# Altium footprint library ZLS_Lib.PcbLib: 157 footprints (part 4 of 10)
Each footprint in its own frame and in the unit in brackets; x right, y up, seen from the top. Pads: shape width x height; smd on the part's side, far side on the other; paste and mask are expansions set on the pad; w line width, h text height; cw(c..) or ccw(c..) is an arc to the next point about the centre after c.
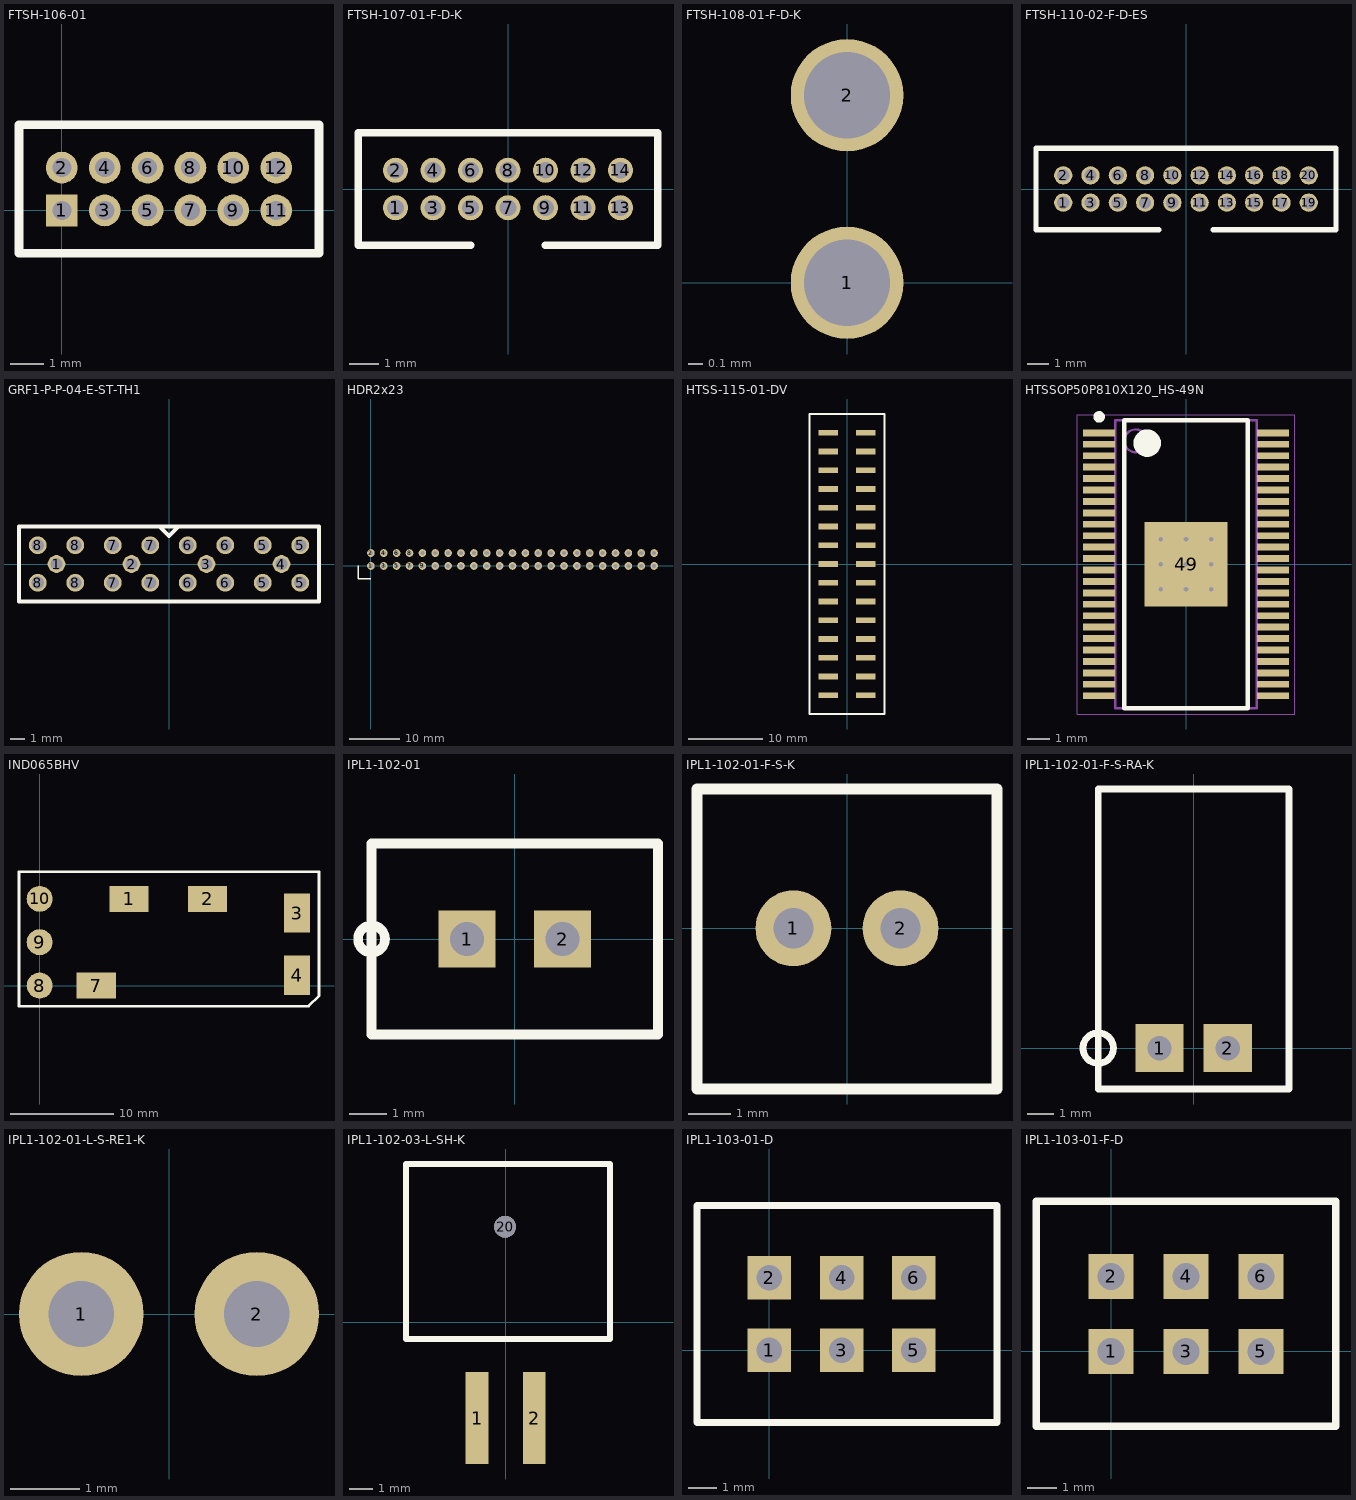
[diagram p3: the footprints below, top view; thin cyan lines are the x and y axes]

## FTSH-106-01 [mil]
height 433.07
pads (12):
  rect 37x37 hole 22.27: 1(0,0)
  round 37 hole 22.27 paste+2: 2(0,50)
  round 37 hole 22.27: 3(50,0) 4(50,50) 5(100,0) 6(100,50) 7(150,0) 8(150,50) 9(200,0) 10(200,50) 11(250,0) 12(250,50)
Top Overlay:
  lines w10: -50,-50 -50,100 300,100 300,-50 -50,-50
3D body "_FTSH_106_01_F_D_001_K_body_2.sldprt": height 225, standoff 0, extent -29,-76 271,124
3D body "_FTSH_106_01_F_D_K_pins1_4.sldprt": height 219, standoff 50, extent -12,-9 254,57
3D body "_FTSH_106_01_F_D_K_pins2_6.sldprt": height 26.18, standoff -90, extent -10,-6 256,60

## FTSH-107-01-F-D-K [mm]
height 10
pads (14):
  round 0.85 hole 0.57: 1(-3.81,-0.635) 2(-3.81,0.635) 3(-2.54,-0.635) 4(-2.54,0.635) 5(-1.27,-0.635) 6(-1.27,0.635) 7(0,-0.635) 8(0,0.635) 9(1.27,-0.635) 10(1.27,0.635) 11(2.54,-0.635) 12(2.54,0.635) 13(3.81,-0.635) 14(3.81,0.635)
Top Overlay:
  lines w0.254: -1.27,-1.905 -5.08,-1.905 -5.08,1.905 5.08,1.905 5.08,-1.905 1.27,-1.905
3D body "_FTSH_107_01_F_D_K_body_2.sldprt": height 5.71, standoff 0, extent -4.445,-2.54 4.445,2.54
3D body "_FTSH_107_01_F_D_K_pins2_6.sldprt": height 1.16, standoff -1.79, extent -4.013,-0.889 4.013,0.787
3D body "_FTSH_107_01_F_D_K_pins2_6.sldprt": height 4.79, standoff 1.84, extent -4.013,-0.838 4.013,0.838

## FTSH-108-01-F-D-K [mil]
height 440.16
pads (2):
  round 30 hole 23: 1(0,0) 2(0,50)

## FTSH-110-02-F-D-ES [mm] "CONN HEADER VERT 20POS 1.27MM"
height 2.51
pads (20):
  round 0.85 hole 0.57: 1(-5.715,-0.635) 2(-5.715,0.635) 3(-4.445,-0.635) 4(-4.445,0.635) 5(-3.175,-0.635) 6(-3.175,0.635) 7(-1.905,-0.635) 8(-1.905,0.635) 9(-0.635,-0.635) 10(-0.635,0.635) 11(0.635,-0.635) 12(0.635,0.635) 13(1.905,-0.635) 14(1.905,0.635) 15(3.175,-0.635) 16(3.175,0.635) 17(4.445,-0.635) 18(4.445,0.635) 19(5.715,-0.635) 20(5.715,0.635)
Top Overlay:
  lines w0.254: -1.27,-1.905 -6.985,-1.905 -6.985,1.905 6.985,1.905 6.985,-1.905 1.27,-1.905
3D body "_FTSH_110_02_F_D_ES_pins1_4.sldprt": height 4.42, standoff 1.27, extent -5.918,-0.838 5.918,0.838
3D body "_FTSH_110_02_F_D_ES_pins2_6.sldprt": height 0.66, standoff -2.29, extent -5.918,-0.838 5.918,0.838
3D body "_FTSH_110_02_F_D_ES_body_2.sldprt": height 2.51, standoff 0, extent -6.35,-1.778 6.35,1.651
3D body "_FTSH_ES_shrouds_8.sldprt": height 4.52, standoff 0.25, extent -7.328,-2.438 -0.597,2.337
3D body "_FTSH_ES_shrouds_8.sldprt": height 4.52, standoff 0.25, extent 0.762,-2.438 7.493,2.337

## GRF1-P-P-04-E-ST-TH1 [mm]
height 4.5
pads (20):
  round 1.2 hole 0.84: 1(-7.62,0) 2(-2.54,0) 3(2.54,0) 4(7.62,0) 5(6.35,-1.27) 5(6.35,1.27) 5(8.89,-1.27) 5(8.89,1.27) 6(1.27,-1.27) 6(1.27,1.27) 6(3.81,-1.27) 6(3.81,1.27) 7(-3.81,-1.27) 7(-3.81,1.27) 7(-1.27,-1.27) 7(-1.27,1.27) 8(-8.89,-1.27) 8(-8.89,1.27) 8(-6.35,-1.27) 8(-6.35,1.27)
Top Overlay:
  lines w0.254: -0.635,2.54 0,1.905 0.635,2.54 ; -10.16,-2.54 10.16,-2.54 10.16,2.54 -10.16,2.54 -10.16,-2.54
3D body "_GRF1_P_P_04_E_ST_TH1_p_8.sldprt": height 4.5, standoff -2.8, extent -8.045,-0.425 -7.195,0.425
3D body "_GRF1_P_P_04_E_ST_TH1_p_8.sldprt": height 4.5, standoff -2.8, extent 2.115,-0.425 2.965,0.425
3D body "_GRF1_P_P_04_E_ST_TH1_p_8.sldprt": height 4.5, standoff -2.8, extent 7.195,-0.425 8.045,0.425
3D body "_GRF1_P_P_04_E_ST_TH1_sh_4.sldprt": height 4.5, standoff -2.8, extent -9.37,-1.75 -5.87,1.75
3D body "_GRF1_P_P_04_E_ST_TH1_b_2.sldprt": height 3.8, standoff 0, extent -10,-2.5 10,2.5
3D body "_GRF1_P_P_04_E_ST_TH1_sh_4.sldprt": height 4.5, standoff -2.8, extent 0.79,-1.75 4.29,1.75
3D body "_GRF1_P_P_04_E_ST_TH1_sh_4.sldprt": height 4.5, standoff -2.8, extent 5.87,-1.75 9.37,1.75
3D body "_GRF1_P_P_04_E_ST_TH1_sh_4.sldprt": height 4.5, standoff -2.8, extent -4.29,-1.75 -0.79,1.75
3D body "_GRF1_P_P_04_E_ST_TH1_p_8.sldprt": height 4.5, standoff -2.8, extent -2.965,-0.425 -2.115,0.425
3D body "_GRF1_P_P_04_E_ST_TH1_i_6.sldprt": height 3.25, standoff 0.25, extent -8.78,-1.16 -6.46,1.16
3D body "_GRF1_P_P_04_E_ST_TH1_i_6.sldprt": height 3.25, standoff 0.25, extent -3.7,-1.16 -1.38,1.16
3D body "_GRF1_P_P_04_E_ST_TH1_i_6.sldprt": height 3.25, standoff 0.25, extent 1.38,-1.16 3.7,1.16
3D body "_GRF1_P_P_04_E_ST_TH1_i_6.sldprt": height 3.25, standoff 0.25, extent 6.46,-1.16 8.78,1.16

## HDR2x23 [mil]
height 375
pads (46):
  round 60 hole 31.5: 1(0,0) 2(0,100) 3(100,0) 4(100,100) 5(200,0) 6(200,100) 7(300,0) 8(300,100) 9(400,0) 10(400,100) 11(500,0) 12(500,100) 13(600,0) 14(600,100) 15(700,0) 16(700,100) 17(800,0) 18(800,100) 19(900,0) 20(900,100) 21(1000,0) 22(1000,100) 23(1100,0) 24(1100,100) 25(1200,0) 26(1200,100) 27(1300,0) 28(1300,100) 29(1400,0) 30(1400,100) 31(1500,0) 32(1500,100) 33(1600,0) 34(1600,100) 35(1700,0) 36(1700,100) 37(1800,0) 38(1800,100) 39(1900,0) 40(1900,100) 41(2000,0) 42(2000,100) 43(2100,0) 44(2100,100) 45(2200,0) 46(2200,100)
Top Overlay:
  lines w10: -100,0 -100,-100 0,-100
3D body: height 375, standoff 0, extent -34,-34 2234,134
3D body: height 375, standoff 0, extent -105,-105 5,5
3D body: height 375, standoff 0, extent -100.02,-100.02 0.02,0.02
3D body: height 375, standoff 0, extent -105,-105 2234,134

## HTSS-115-01-DV [mil]
height 385.04
pads (30):
  rect 105x31 smd: 1(-100,700) 2(100,700) 3(-100,600) 4(100,600) 5(-100,500) 6(100,500) 7(-100,400) 8(100,400) 9(-100,300) 10(100,300) 11(-100,200) 12(100,200) 13(-100,100) 14(100,100) 15(-100,0) 16(100,0) 17(-100,-100) 18(100,-100) 19(-100,-200) 20(100,-200) 21(-100,-300) 22(100,-300) 23(-100,-400) 24(100,-400) 25(-100,-500) 26(100,-500) 27(-100,-600) 28(100,-600) 29(-100,-700) 30(100,-700)
Top Overlay:
  lines w10: -200,-800 50,-800 ; -200,-800 -200,700 -200,800 200,800 200,-800 50,-800 ; -200,-800 50,-800
3D body "_T1SSW_115_22_G_D_VS_2.sldprt": height 345, standoff 10, extent -97.5,-760 97.5,760
3D body "_P2SSW_115_22_G_D_VS_4.sldprt": height 90, standoff 0, extent -145,-721 165,720

## HTSSOP50P810X120_HS-49N [mm] "HTSSOP, 48-Leads, Body 12.50x6.10mm, Pitch 0.50mm, Thermal Pad 3.70x3.65mm, IPC Medium Density"
height 1.2
pads (49):
  rect 1.4x0.3 smd: 1(-3.8,5.75) 2(-3.8,5.25) 3(-3.8,4.75) 4(-3.8,4.25) 5(-3.8,3.75) 6(-3.8,3.25) 7(-3.8,2.75) 8(-3.8,2.25) 9(-3.8,1.75) 10(-3.8,1.25) 11(-3.8,0.75) 12(-3.8,0.25) 13(-3.8,-0.25) 14(-3.8,-0.75) 15(-3.8,-1.25) 16(-3.8,-1.75) 17(-3.8,-2.25) 18(-3.8,-2.75) 19(-3.8,-3.25) 20(-3.8,-3.75) 21(-3.8,-4.25) 22(-3.8,-4.75) 23(-3.8,-5.25) 24(-3.8,-5.75) 25(3.8,-5.75) 26(3.8,-5.25) 27(3.8,-4.75) 28(3.8,-4.25) 29(3.8,-3.75) 30(3.8,-3.25) 31(3.8,-2.75) 32(3.8,-2.25) 33(3.8,-1.75) 34(3.8,-1.25) 35(3.8,-0.75) 36(3.8,-0.25) 37(3.8,0.25) 38(3.8,0.75) 39(3.8,1.25) 40(3.8,1.75) 41(3.8,2.25) 42(3.8,2.75) 43(3.8,3.25) 44(3.8,3.75) 45(3.8,4.25) 46(3.8,4.75) 47(3.8,5.25) 48(3.8,5.75)
  rect 3.65x3.7 smd: 49(0,0)
via 1.1,-1.1 diameter 0.5 hole 0.2
via 0,-1.1 diameter 0.5 hole 0.2
via -1.1,-1.1 diameter 0.5 hole 0.2
via 1.1,0 diameter 0.5 hole 0.2
via 0,0 diameter 0.5 hole 0.2
via -1.1,0 diameter 0.5 hole 0.2
via 1.1,1.1 diameter 0.5 hole 0.2
via 0,1.1 diameter 0.5 hole 0.2
via -1.1,1.1 diameter 0.5 hole 0.2
Top Overlay:
  circle w0.6: c-1.7,5.3 r0.3
  circle w0.25: c-3.8,6.45 r0.125
  lines w0.2: -2.7,-6.3 2.7,-6.3 2.7,6.3 -2.7,6.3 -2.7,-6.3
Mechanical 13:
  circle w0.1: c-2.2,5.4 r0.5
  lines w0.1: -3.1,-6.3 3.1,-6.3 3.1,6.3 -3.1,6.3 -3.1,-6.3
Mechanical 15:
  lines w0.05: -4.75,-6.55 4.75,-6.55 4.75,6.55 -4.75,6.55 -4.75,-6.55
  lines w0.1: -0.5,0 0.5,0 ; 0,-0.5 0,0.5
3D body "HTSSOP50P810X120_HS-49N.step": height 1.2, standoff 0, extent -4.05,-6.3 4.05,6.3

## IND065BHV [mm] "DC DC CONVERTER 32-54V 65W"
height 10
pads (8):
  rect 3.78x2.51 smd: 1(8.65,8.38) 2(16.24,8.38) 7(5.47,0)
  rect 2.51x3.78 smd: 3(24.89,7) 4(24.89,1)
  round 2.51 smd: 8(0,0) 9(0,4.19) 10(0,8.38)
Top Overlay:
  lines w0.254: -2,-2 -2,11 27,11 27,-1 26,-2 -2,-2
3D body "ABXS002A3X41-SRZ--3DModel-STEP-56544.STEP": height 5.92, standoff -1.57, extent -1.524,-1.524 26.416,9.906

## IPL1-102-01 [mil]
height 161
pads (2):
  rect 60x60 hole 35.43: 1(-50,0) 2(50,0)
Top Overlay:
  circle w10: c-150,0 r14.14
  lines w10: -150,-100 150,-100 150,100 -150,100 -150,-100
3D body "_IPL1_102_01_S_header_2.sldprt": height 320, standoff 0, extent -133.94,-130.91 126.06,129.09

## IPL1-102-01-F-S-K [mm]
height 10
pads (2):
  round 1.8 hole 0.95: 1(-1.27,0) 2(1.27,0)
Top Overlay:
  lines w0.254: -3.556,-3.81 3.556,-3.81 3.556,3.302 -3.556,3.302 -3.556,-3.81
3D body "_T_1S64_01_02_S_4.sldprt": height 7.75, standoff -3.05, extent -1.587,-0.063 1.588,0.572
3D body "_IPL1_102_01_S_K_header_2.sldprt": height 8.13, standoff 0, extent -3.302,-3.556 3.302,3.048

## IPL1-102-01-F-S-RA-K [mm] ".100 TERMINAL ASSEMBLY"
height 5.59
pads (2):
  rect 1.8x1.8 hole 0.91: 1(-1.27,0) 2(1.27,0)
Top Overlay:
  circle w0.254: c-3.556,0 r0.568
  lines w0.254: -3.556,-1.524 3.556,-1.524 3.556,9.652 -3.556,9.652 -3.556,-1.524
3D body "_IPL1_102_01_S_RA_K_header_2.sldprt": height 6.56, standoff -0.05, extent -3.302,1.27 3.302,9.398
3D body "_T_1S64_01_02_S_RA_4.sldprt": height 3.32, standoff -2.21, extent -1.587,-0.317 1.588,9.271

## IPL1-102-01-L-S-RE1-K [mm]
height 12
pads (2):
  round 1.8 hole 0.95: 1(-1.27,0) 2(1.27,0)
3D body "_T_1S64_01_02_S_RE1_4.sldprt": height 4.06, standoff -2.48, extent -1.587,-0.444 1.588,9.144
3D body "_IPL1_102_01_S_RE1_K_header_2.sldprt": height 7.95, standoff 0.07, extent -4.572,1.905 4.572,9.525

## IPL1-102-03-L-SH-K [mm]
pads (3):
  rect 1x4 smd: 1(-1.246,-4.165) 2(1.246,-4.165)
  round 0.95 hole 0.95: 20(-0.024,4.165)
Top Overlay:
  lines w0.254: -4.342,-0.725 -4.342,6.895 4.548,6.895 4.548,-0.725 -4.342,-0.725
3D body "_IPL1_102_03_SH_K_header_2.sldprt": height 6.16, standoff -2.63, extent -4.596,-0.45 4.548,7.17
3D body "_T_1S64_03_02_SH_4.sldprt": height 2.66, standoff -0.45, extent -1.611,-5.885 1.564,6.916

## IPL1-103-01-D [mil]
height 161
pads (6):
  rect 60x60 hole 35.43: 1(0,0) 2(0,100) 3(100,0) 4(100,100) 5(200,0) 6(200,100)
Top Overlay:
  lines w10: -100,-100 -26,-100 315,-100 315,200 -100,200 -100,-26 -100,-100
3D body "_T_1S64_01_03_D_4.sldprt": height 305, standoff -120, extent -7.87,-11.81 217.12,113.19
3D body "_IPL1_103_01_D_header_2.sldprt": height 320, standoff 0, extent -80,-100 280,210
3D body: height 161, standoff 0, extent -100.02,-26.02 -100.01,-26.01

## IPL1-103-01-F-D [mil]
pads (6):
  rect 60x60 hole 35.43: 1(0,0) 2(0,100) 3(100,0) 4(100,100) 5(200,0) 6(200,100)
Top Overlay:
  lines w10: -100,-100 -100,-26 -100,200 300,200 300,-100 -26,-100 -100,-100
3D body: height 161, standoff 0, extent -100.02,-26.02 -100.01,-26.01
3D body "_IPL1_103_01_D_header_2.sldprt": height 320, standoff 0, extent -80,-100 280,210
3D body "_T_1S64_01_03_D_4.sldprt": height 305, standoff -120, extent -7.87,-11.81 217.12,113.19